# Altium footprint library Apalis Evaluation Board.PcbLib: 166 footprints (part 4 of 11)
Each footprint in its own frame and in the unit in brackets; x right, y up, seen from the top. Pads: shape width x height; smd on the part's side, far side on the other; paste and mask are expansions set on the pad; w line width, h text height; cw(c..) or ccw(c..) is an arc to the next point about the centre after c.
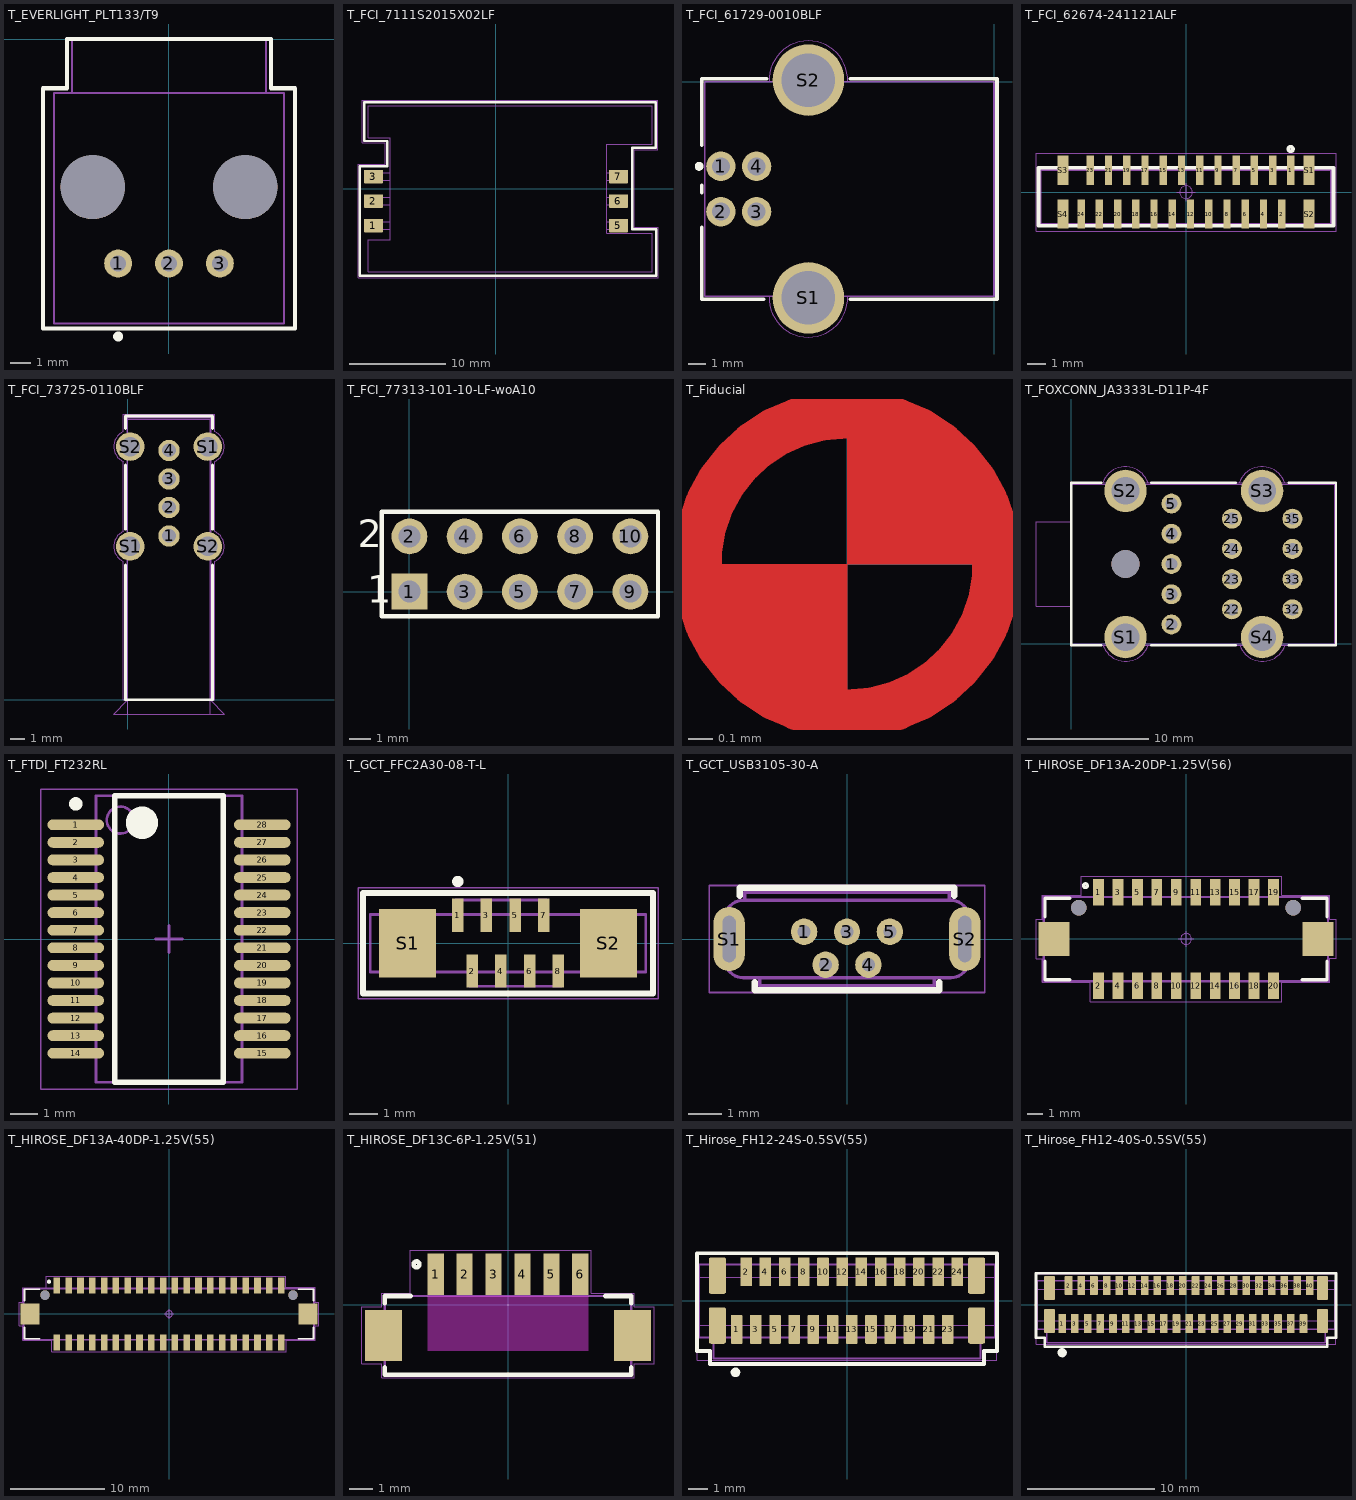
[diagram p3: the footprints below, top view; thin cyan lines are the x and y axes]

## T_EVERLIGHT_PLT133/T9 [mm] "USB Type B Connectors"
height 20
pads (5):
  round 1.4 hole 0.8: 1(-2.54,-11.21) 2(0,-11.21) 3(2.54,-11.21)
  round 3.2 hole 3.2 unplated: ""(-3.81,-7.4) ""(3.81,-7.4)
Top Overlay:
  circle w0.25: c-2.54,-14.86 r0.125
  lines w0.2: -6.3,-14.46 6.3,-14.46 6.3,-2.46 5.1,-2.46 5.1,0 -5.1,0 -5.1,-2.46 -6.3,-2.46 -6.3,-14.46
Mechanical 1:
  lines w0.05: -6.3,-14.46 -6.3,-2.46 -5.1,-2.46 -5.1,0 5.1,0 5.1,-2.46 6.3,-2.46 6.3,-14.46 -6.3,-14.46
Mechanical 2:
  lines w0.01: -4.85,-2.7 -4.85,0 4.85,0 4.85,-2.7 ; -5.75,-14.21 5.75,-14.21 5.75,-2.7 -5.75,-2.7 -5.75,-14.21
Mechanical 3:
  lines w0.1: -4.85,-2.7 -4.85,0 4.85,0 4.85,-2.7 ; -5.75,-14.21 5.75,-14.21 5.75,-2.7 -5.75,-2.7 -5.75,-14.21
3D body: height 19.12, standoff -4.15, extent -5.75,-13.715 5.75,0.085

## T_FCI_7111S2015X02LF [mm] "6 Contacts Sim Card Holder"
height 2.5
pads (6):
  rrect12% 2x1.4 smd: 1(-12.7,-3.81) 2(-12.7,-1.27) 3(-12.7,1.27) 5(12.7,-3.81) 6(12.7,-1.27) 7(12.7,1.27)
Top Overlay:
  lines w0.254: -14.1,-9 -14.1,2.35 -11.25,2.35 -11.25,4.95 -13.65,4.95 -13.65,8.95 16.55,8.95 16.55,4.25 14.15,4.25 14.15,-4.2 16.6,-4.2 16.6,-9 -14.1,-9
Mechanical 1:
  lines w0.05: -14.3,-9.2 16.8,-9.2 16.8,-4 14.35,-4 14.35,4.05 16.75,4.05 16.75,9.15 -13.85,9.15 -13.85,4.75 -11.45,4.75 -11.45,2.55 -14.3,2.55 -14.3,-9.2
Mechanical 2:
  lines w0.01: -10.95,-4.21 -13.25,-4.21 -13.25,-3.41 -10.95,-3.41 ; -10.95,-1.67 -13.25,-1.67 -13.25,-0.87 -10.95,-0.87 ; -10.95,0.87 -13.25,0.87 -13.25,1.67 -10.95,1.67 ; 11.49,-4.21 13.25,-4.21 13.25,-3.41 11.49,-3.41 ; 11.49,-1.67 13.25,-1.67 13.25,-0.87 11.49,-0.87 ; 11.49,0.87 13.25,0.87 13.25,1.67 11.49,1.67 ; -13.25,-8.6 -13.25,-5.3 -10.95,-5.3 -10.95,5.3 -13.25,5.3 -13.25,8.6 16.19,8.6 16.19,4.6 11.49,4.6 11.49,-4.6 16.19,-4.6 16.19,-8.6 -13.25,-8.6
Mechanical 3:
  lines w0.1: -13.25,-8.6 16.19,-8.6 16.19,-4.6 11.49,-4.6 11.49,4.6 16.19,4.6 16.19,8.6 -13.25,8.6 -13.25,5.3 -10.95,5.3 -10.95,-5.3 -13.25,-5.3 -13.25,-8.6
3D body: height 2.5, standoff 0, extent -13.552,-8.726 16.448,8.574

## T_FCI_61729-0010BLF [mm] "USB Type B Connectors"
height 10.6
pads (6):
  round 1.65 hole 1: 1(-15.3,-4.73) 2(-15.3,-7.27) 3(-13.3,-7.27) 4(-13.3,-4.73)
  round 4 hole 3: S1(-10.4,-12.1) S2(-10.4,0.1)
Top Overlay:
  circle w0.25: c-16.512,-4.73 r0.125
  lines w0.2: -16.362,-8.14 -16.362,-12.163 -12.89,-12.163 ; -16.362,-6.21 -16.362,-5.8 ; -16.362,-3.55 -16.362,0.162 -12.737,0.162 ; -8.062,-12.163 0.163,-12.163 0.163,0.162 -8.062,0.162
Mechanical 1:
  lines w0.05: -16.2,-12 -12.598,-12 ccw(c-10.4,-12.096) -8.202,-12 0,-12 0,-0.003 -0.003,0 -8.202,0 ccw(c-10.4,0.096) -12.598,0 -16.2,0 -16.2,-12
Mechanical 2:
  lines w0.001: -16.2,-12 0,-12 0,0 -16.2,0 -16.2,-12
Mechanical 3:
  lines w0.1: -16.2,-12 0,-12 0,0 -16.2,0 -16.2,-12
3D body: height 11.02, standoff -3.7, extent -16.61,-13.43 -0.31,1.469

## T_FCI_62674-241121ALF [mm] "DVI FFC Connector 0.5mm pitch"
height 4.1
pads (28):
  rect 0.4x1.6 smd: 1(5.75,1.2) 2(5.25,-1.2) 3(4.75,1.2) 4(4.25,-1.2) 5(3.75,1.2) 6(3.25,-1.2) 7(2.75,1.2) 8(2.25,-1.2) 9(1.75,1.2) 10(1.25,-1.2) 11(0.75,1.2) 12(0.25,-1.2) 13(-0.25,1.2) 14(-0.75,-1.2) 15(-1.25,1.2) 16(-1.75,-1.2) 17(-2.25,1.2) 18(-2.75,-1.2) 19(-3.25,1.2) 20(-3.75,-1.2) 21(-4.25,1.2) 22(-4.75,-1.2) 23(-5.25,1.2) 24(-5.75,-1.2)
  rect 0.6x1.6 smd: S1(6.75,1.2) S2(6.75,-1.199) S3(-6.75,1.2) S4(-6.75,-1.2)
Top Overlay:
  circle w0.2: c5.742,2.367 r0.125
  lines w0.2: -8.089,-1.836 8.086,-1.836 8.086,1.342 -8.086,1.342 -8.086,-1.831
Mechanical 1:
  circle w0.05: c0,0 r0.35
  lines w0.05: -0.5,0 0.5,0 ; 0,-0.5 0,0.5 ; -8.226,-2.141 8.226,-2.141 8.226,2.141 -8.226,2.141 -8.226,-2.141
Mechanical 2:
  lines w0.001: -7.95,-1.7 7.95,-1.7 7.95,1.2 -7.95,1.2 -7.95,-1.7
Mechanical 3:
  lines w0.1: -8.011,-1.761 8.011,-1.761 8.011,1.276 -8.011,1.276 -8.011,-1.761

## T_FCI_73725-0110BLF [mm] "USB Type A Connector Vertical"
height 13.83
pads (8):
  round 1.5 hole 0.95: 1(2.88,11.49) 2(2.88,13.49) 3(2.88,15.49) 4(2.88,17.49)
  round 2 hole 1.37: S1(0.16,10.76) S1(5.6,17.76) S2(0.16,17.76) S2(5.6,10.76)
Top Overlay:
  lines w0.2: -0.166,9.463 -0.166,0 5.926,0 5.926,9.463 ; -0.166,11.964 -0.166,16.474 ; -0.166,19.025 -0.166,19.898 5.926,19.898 5.926,19.025 ; 5.922,11.964 5.922,16.474
Mechanical 1:
  lines w0.05: -0.322,9.709 -0.322,0 6.081,0 6.081,9.707 ; -0.322,18.812 -0.322,20.046 -0.32,20.048 6.081,20.048 ; -0.321,9.708 cw(c0.16,10.76) -0.322,11.812 ; -0.321,11.813 -0.321,16.708 cw(c0.16,17.76) -0.322,18.812 ; 6.081,16.707 6.081,11.812 cw(c5.6,10.76) 6.082,9.708 ; 6.081,18.812 cw(c5.6,17.76) 6.082,16.708 ; 6.082,18.814 6.082,20.048
Mechanical 2:
  lines w0.001: 0,-1 0,19.678 5.76,19.678 5.76,-1 ; -1,-1 0,0 5.76,0 6.76,-1 -1,-1
Mechanical 3:
  lines w0.1: -0.068,19.778 5.826,19.778 5.826,0 -0.065,0 -0.065,19.778

## T_FCI_77313-101-10-LF-woA10 [mm] "2.54 mm header"
height 10.8
pads (10):
  rect 1.65x1.65 hole 1: 1(0,0)
  round 1.65 hole 1: 2(0,2.54) 3(2.54,0) 4(2.54,2.54) 5(5.08,0) 6(5.08,2.54) 7(7.62,0) 8(7.62,2.54) 9(10.16,0) 10(10.16,2.54)
Top Overlay:
  lines w0.2: -1.27,-1.14 11.43,-1.14 ; -1.27,-1.137 -1.27,3.68 11.43,3.68 11.43,-1.137
  text "2" at -2.364,2.048 h1.27
  text "1" at -1.941,-0.522 h1.27
Mechanical 1:
  lines w0.05: -1.27,-1.14 11.43,-1.14 ; -1.27,-1.137 -1.27,3.68 11.43,3.68 11.43,-1.137
Mechanical 2:
  lines w0.001: -1.27,-1.14 11.43,-1.14 11.43,3.68 -1.27,3.68 -1.27,-1.14
Mechanical 3:
  lines w0.1: -1.27,-1.14 11.43,-1.14 ; -1.27,-1.137 -1.27,3.68 11.43,3.68 11.43,-1.137

## T_Fiducial [mm] "Fiducial"
Top Layer:
  region: 0,-0.625 -0.375,-0.5 -0.625,-0.25 -0.625,0 0,0
  region: 0.625,0 0,0 0,0.625 0.375,0.5 0.625,0.25
  lines w0.203: 0,-0.625 ccw(c0,0) 0,0.625 ccw(c0,0) 0,-0.625
Top Solder:
  circle w0.203: c0,0 r0.625
  region: 0.625,0 0.5,-0.375 0.25,-0.625 -0.25,-0.625 -0.5,-0.375 -0.625,0 -0.5,0.375 -0.375,0.5 0,0.625 0.375,0.5 0.5,0.25 0.5,0.375 0.375,0.5

## T_FOXCONN_JA3333L-D11P-4F [mm] "Audio Jack Triple Stacked DIP Type With Sense"
height 35.5
pads (18):
  round 1.65 hole 1: 1(8.3,6.6) 2(8.3,1.6) 3(8.3,4.1) 4(8.3,9.1) 5(8.3,11.6) 22(13.3,2.85) 23(13.3,5.35) 24(13.3,7.85) 25(13.3,10.35) 32(18.3,2.85) 33(18.3,5.35) 34(18.3,7.85) 35(18.3,10.35)
  round 3.5 hole 2.3: S1(4.5,0.55) S2(4.5,12.65) S3(15.8,12.65) S4(15.8,0.55)
  round 2.3 hole 2.3 unplated: ""(4.5,6.6)
Top Overlay:
  lines w0.2: 0,-0.105 2.5,-0.105 ; 0,-0.082 0,13.305 2.5,13.305 ; 6.625,-0.105 13.625,-0.105 ; 6.625,13.305 13.625,13.305 ; 18,-0.105 21.903,-0.105 21.905,-0.105 21.905,13.305 18,13.305
Mechanical 1:
  lines w0.05: 2.604,13.299 cw(c4.484,12.666) 6.363,13.301 ; 2.604,13.3 0,13.3 0,-0.1 2.637,-0.1 ; 2.637,-0.101 ccw(c4.516,0.533) 6.396,-0.099 ; 6.363,13.3 13.904,13.3 ; 6.396,-0.1 13.937,-0.1 ; 13.904,13.299 cw(c15.784,12.666) 17.663,13.301 ; 13.937,-0.101 ccw(c15.816,0.533) 17.696,-0.099 ; 17.663,13.3 21.9,13.3 21.9,-0.1 17.696,-0.1
Mechanical 2:
  lines w0.001: 0,3.1 -2.9,3.1 -2.9,10.1 0,10.1 ; 0,0 0,13.2 21.8,13.2 21.8,0 0,0
Mechanical 3:
  lines w0.1: 0,-0.1 21.901,-0.1 ; 0,13.3 21.9,13.3 21.902,13.298 21.902,-0.1 ; 0.001,-0.074 0.001,13.326 ; 21.901,-0.1 21.902,-0.1
3D body: height 31.5, standoff 28.5, extent -2.905,5.105 0.01,8.093
3D body: height 19, standoff 16, extent -2.905,5.105 0.01,8.093
3D body: height 6.5, standoff 3.5, extent -2.905,5.105 0.01,8.093
3D body: height 21.01, standoff 13.99, extent -2.9,3.1 0,10.1
3D body: height 33.51, standoff 26.49, extent -2.9,3.1 0,10.1
3D body: height 8.51, standoff 1.49, extent -2.9,3.1 0,10.1
3D body: height 38.5, standoff 0, extent 0,0 21.8,13.2

## T_FTDI_FT232RL [mm] "28-Pin SSOP 0.65 mm Pitch"
height 2
pads (28):
  oval 2.1x0.4 smd: 1(-3.45,4.225) 2(-3.45,3.575) 3(-3.45,2.925) 4(-3.45,2.275) 5(-3.45,1.625) 6(-3.45,0.975) 7(-3.45,0.325) 8(-3.45,-0.325) 9(-3.45,-0.975) 10(-3.45,-1.625) 11(-3.45,-2.275) 12(-3.45,-2.925) 13(-3.45,-3.575) 14(-3.45,-4.225) 15(3.45,-4.225) 16(3.45,-3.575) 17(3.45,-2.925) 18(3.45,-2.275) 19(3.45,-1.625) 20(3.45,-0.975) 21(3.45,-0.325) 22(3.45,0.325) 23(3.45,0.975) 24(3.45,1.625) 25(3.45,2.275) 26(3.45,2.925) 27(3.45,3.575) 28(3.45,4.225)
Top Overlay:
  circle w0.6: c-1,4.3 r0.3
  circle w0.25: c-3.45,5 r0.125
  lines w0.2: -2,-5.3 2,-5.3 2,5.3 -2,5.3 -2,-5.3
Mechanical 1:
  lines w0.05: -4.75,-5.55 -4.75,5.55 4.75,5.55 4.75,-5.55 -4.75,-5.55
  lines w0.1: -0.5,0 0.5,0 ; 0,-0.5 0,0.5
Mechanical 2:
  lines w0.001: -2.7,-5.3 2.7,-5.3 2.7,5.3 -2.7,5.3 -2.7,-5.3
Mechanical 3:
  circle w0.1: c-1.8,4.4 r0.5
  lines w0.1: -2.7,-5.3 -2.7,5.3 2.7,5.3 2.7,-5.3 -2.7,-5.3
3D body: height 2, standoff 0, extent -2.7,-5.3 2.7,5.3

## T_GCT_FFC2A30-08-T-L [mm] "JTAG FFC Connector 0.5mm pitch vertical"
height 5.4
pads (10):
  rect 0.4x1.15 smd: 1(-1.75,0.975) 2(-1.25,-0.975) 3(-0.75,0.975) 4(-0.25,-0.975) 5(0.25,0.975) 6(0.75,-0.975) 7(1.25,0.975) 8(1.75,-0.975)
  rect 2x2.4 smd: S1(-3.5,0) S2(3.5,0)
Top Overlay:
  circle w0.254: c-1.75,2.15 r0.071
  lines w0.2: -5.05,-1.75 -5.05,1.75 5.05,1.75 5.05,-1.75 -5.05,-1.75
Mechanical 1:
  lines w0.05: -5.225,-1.925 -5.225,1.925 5.225,1.925 5.225,-1.925 -5.225,-1.925
Mechanical 2:
  lines w0.001: -4.25,-1 -4.25,1 ; -1.85,1 -1.85,1.5 1.35,1.5 1.35,1 ; -1.35,-1 -1.35,-1.5 1.85,-1.5 1.85,-1 ; 4.25,-1 4.25,1 ; -4.8,-1 -4.8,1 4.8,1 4.8,-1 -4.8,-1
Mechanical 3:
  lines w0.1: -1.85,1 -1.85,1.5 1.35,1.5 1.35,1 ; -1.35,-1 -1.35,-1.5 1.85,-1.5 1.85,-1 ; -4.8,-1 4.8,-1 4.8,1 -4.8,1 -4.8,-1
3D body: height 4.4, standoff 2.5, extent -4.8,-1 4.8,1
3D body: height 2.5, standoff 0, extent -4.25,-1 4.25,1

## T_GCT_USB3105-30-A [mm] "Micro USB Connector Vertical"
height 5.6
pads (7):
  round 0.8 hole 0.4: 1(-1.3,0.22) 2(-0.65,-0.78) 3(0,0.22) 4(0.65,-0.78) 5(1.3,0.22)
  oval 0.95x1.95 hole 0.4 slot 1.4 at 90 deg: S1(-3.575,0) S2(3.575,0)
Top Overlay:
  lines w0.2: -3.25,1.32 -3.25,1.55 3.25,1.55 3.25,1.32 ; -2.8,-1.32 -2.8,-1.55 2.8,-1.55 2.8,-1.32
Mechanical 1:
  lines w0.05: -4.175,-1.625 -4.175,1.625 4.175,1.625 4.175,-1.625 -4.175,-1.625
Mechanical 2:
  lines w0.001: -3.7,-0.175 -3.945,-0.175 -3.945,0.625 -3.7,0.625 ; -3.1,1.175 -3.1,1.42 3.1,1.42 3.1,1.175 ; -2.65,-1.175 -2.65,-1.42 2.65,-1.42 2.65,-1.175 ; 3.15,1.175 cw(c3.15,0.625) 3.7,0.625 ; 3.175,1.175 -3.15,1.175 ccw(c-3.15,0.625) -3.7,0.625 ; 3.7,-0.175 3.945,-0.175 3.945,0.625 3.7,0.625 ; -3.7,0.625 -3.7,-0.625 ccw(c-3.15,-0.625) -3.15,-1.175 3.15,-1.175 ccw(c3.15,-0.625) 3.7,-0.625 3.7,0.625
Mechanical 3:
  lines w0.1: -3.7,-0.175 -3.945,-0.175 -3.945,0.625 -3.7,0.625 ; -3.1,1.175 -3.1,1.42 3.1,1.42 3.1,1.175 ; -2.65,-1.175 -2.65,-1.42 2.65,-1.42 2.65,-1.175 ; 3.15,1.175 cw(c3.15,0.625) 3.7,0.625 ; 3.175,1.175 -3.15,1.175 ccw(c-3.15,0.625) -3.7,0.625 ; 3.7,-0.175 3.945,-0.175 3.945,0.625 3.7,0.625 ; -3.7,0.625 -3.7,-0.625 ccw(c-3.15,-0.625) -3.15,-1.175 3.15,-1.175 ccw(c3.15,-0.625) 3.7,-0.625 3.7,0.625
3D body: height 5.62, standoff -1.48, extent -3.98,-1.455 3.98,1.48

## T_HIROSE_DF13A-20DP-1.25V(56) [mm]
height 4.8
pads (24):
  rect 0.7x1.7 smd: 1(-5.625,3) 2(-5.625,-3) 3(-4.375,3) 4(-4.375,-3) 5(-3.125,3) 6(-3.125,-3) 7(-1.875,3) 8(-1.875,-3) 9(-0.625,3) 10(-0.625,-3) 11(0.625,3) 12(0.625,-3) 13(1.875,3) 14(1.875,-3) 15(3.125,3) 16(3.125,-3) 17(4.375,3) 18(4.375,-3) 19(5.625,3) 20(5.625,-3)
  rect 2x2.2 smd: ""(-8.475,0) ""(8.475,0)
  round 1 hole 1 unplated paste+0 mask+0: ""(-6.875,2) ""(6.875,2)
Top Overlay:
  circle w0.2: c-6.455,3.42 r0.125
  lines w0.2: -9.04,-1.42 -9.04,-2.62 -7.463,-2.62 ; -9.04,1.41 -9.04,2.61 -7.463,2.61 ; 7.463,-2.62 9.04,-2.62 9.04,-1.42 ; 7.463,2.61 9.04,2.61 9.04,1.41
Mechanical 1:
  circle w0.05: c0,0 r0.35
  lines w0.05: -0.5,0 0.5,0 ; 0,-0.5 0,0.5 ; 9.222,1.255 9.222,2.804 8.052,2.804 6.136,2.804 6.136,4.01 -6.726,4.01 -6.726,2.796 -9.216,2.796 -9.216,1.652 -9.216,1.252 -9.63,1.252 -9.63,-1.258 -9.218,-1.258 -9.218,-2.796 -6.142,-2.796 -6.142,-4.02 6.143,-4.02 6.143,-2.796 9.221,-2.796 9.221,-1.248 9.63,-1.248 ; 9.224,1.255 9.63,1.255 9.63,-1.237
Mechanical 2:
  lines w0.001: -9.175,-2.75 -9.175,2.75 9.175,2.75 9.175,-2.75 -9.175,-2.75
Mechanical 3:
  lines w0.1: -9.1,-2.68 -9.1,2.67 9.1,2.67 9.1,-2.68 -9.1,-2.68
3D body: height 4.8, standoff 0, extent -9.175,-3.45 9.175,3.45

## T_HIROSE_DF13A-40DP-1.25V(55) [mm]
height 4.8
pads (44):
  rect 0.7x1.7 smd: 1(-11.875,3) 2(-11.875,-3) 3(-10.625,3) 4(-10.625,-3) 5(-9.375,3) 6(-9.375,-3) 7(-8.125,3) 8(-8.125,-3) 9(-6.875,3) 10(-6.875,-3) 11(-5.625,3) 12(-5.625,-3) 13(-4.375,3) 14(-4.375,-3) 15(-3.125,3) 16(-3.125,-3) 17(-1.875,3) 18(-1.875,-3) 19(-0.625,3) 20(-0.625,-3) 21(0.625,3) 22(0.625,-3) 23(1.875,3) 24(1.875,-3) 25(3.125,3) 26(3.125,-3) 27(4.375,3) 28(4.375,-3) 29(5.625,3) 30(5.625,-3) 31(6.875,3) 32(6.875,-3) 33(8.125,3) 34(8.125,-3) 35(9.375,3) 36(9.375,-3) 37(10.625,3) 38(10.625,-3) 39(11.875,3) 40(11.875,-3)
  rect 2x2.2 smd: ""(-14.725,0) ""(14.725,0)
  round 1 hole 1 unplated paste+0 mask+0: ""(-13.125,2) ""(13.125,2)
Top Overlay:
  circle w0.2: c-12.705,3.42 r0.125
  lines w0.2: -15.29,-1.42 -15.29,-2.62 -13.713,-2.62 ; -15.29,1.41 -15.29,2.61 -13.713,2.61 ; 13.713,-2.62 15.29,-2.62 15.29,-1.42 ; 13.713,2.61 15.29,2.61 15.29,1.41
Mechanical 1:
  circle w0.05: c0,0 r0.35
  lines w0.05: -0.5,0 0.5,0 ; 0,-0.5 0,0.5 ; 15.472,1.255 15.472,2.804 14.302,2.804 12.386,2.804 12.386,4.01 -12.976,4.01 -12.976,2.796 -15.466,2.796 -15.466,1.652 -15.466,1.252 -15.88,1.252 -15.88,-1.258 -15.468,-1.258 -15.468,-2.796 -12.392,-2.796 -12.392,-4.02 12.393,-4.02 12.393,-2.796 15.471,-2.796 15.471,-1.248 15.88,-1.248 ; 15.474,1.255 15.88,1.255 15.88,-1.237
Mechanical 2:
  lines w0.001: -15.425,-2.75 -15.425,2.75 15.425,2.75 15.425,-2.75 -15.425,-2.75
Mechanical 3:
  lines w0.1: -15.35,-2.68 -15.35,2.67 15.35,2.67 15.35,-2.68 -15.35,-2.68
3D body: height 4.82, standoff 0.02, extent -15.425,-3.45 15.425,3.45

## T_HIROSE_DF13C-6P-1.25V(51) [mm] "Touch connector"
height 4.8
pads (8):
  rect 0.7x1.8 smd: 1(-3.125,1.324) 2(-1.875,1.324) 3(-0.625,1.324) 4(0.625,1.324) 5(1.875,1.324) 6(3.125,1.324)
  rect 1.6x2.2 smd: ""(-5.385,-1.324) ""(5.385,-1.324)
Top Overlay:
  circle w0.2: c-3.955,1.744 r0.125
  lines w0.2: -5.325,-2.713 -5.325,-3.024 5.325,-3.024 5.325,-2.713 ; -5.325,0.064 -5.325,0.376 -4.201,0.376 ; 4.201,0.376 5.325,0.376 5.325,0.064
Keep-Out Layer:
  rectangle: -3.475,-1.994 3.475,0.376
Mechanical 1:
  lines w0.05: -6.316,-2.555 -6.316,-0.093 -5.456,-0.093 -5.456,0.506 -4.226,0.506 -4.226,2.354 3.606,2.354 3.606,0.507 5.456,0.507 5.456,-0.092 6.316,-0.093 6.316,-2.555 5.456,-2.555 5.456,-3.155 -5.456,-3.155 -5.456,-2.555 -6.316,-2.555
Mechanical 2:
  lines w0.001: -5.325,-2.224 -6.075,-2.224 -6.075,-0.424 -5.325,-0.424 ; 5.325,-2.224 6.075,-2.224 6.075,-0.424 5.325,-0.424 ; -5.325,-3.024 -5.325,0.376 5.325,0.376 5.325,-3.024 -5.325,-3.024
Mechanical 3:
  lines w0.1: -5.325,-3.024 -5.325,0.376 5.325,0.376 5.325,-3.024 -5.325,-3.024

## T_Hirose_FH12-24S-0.5SV(55) [mm] "FFC Connector 0.5mm pitch Vertical"
height 5.5
pads (28):
  rrect12% 0.6x1.5 smd: 1(-5.75,-1.5) 2(-5.25,1.5) 3(-4.75,-1.5) 4(-4.25,1.5) 5(-3.75,-1.5) 6(-3.25,1.5) 7(-2.75,-1.5) 8(-2.25,1.5) 9(-1.75,-1.5) 10(-1.25,1.5) 11(-0.75,-1.5) 12(-0.25,1.5) 13(0.25,-1.5) 14(0.75,1.5) 15(1.25,-1.5) 16(1.75,1.5) 17(2.25,-1.5) 18(2.75,1.5) 19(3.25,-1.5) 20(3.75,1.5) 21(4.25,-1.5) 22(4.75,1.5) 23(5.25,-1.5) 24(5.75,1.5)
  rrect25% 0.9x1.9 smd: ""(-6.75,-1.3) ""(-6.75,1.3) ""(6.75,-1.3) ""(6.75,1.3)
Top Overlay:
  circle w0.25: c-5.81,-3.738 r0.125
  lines w0.2: -7.814,-2.625 -7.814,2.464 7.814,2.464 7.814,-2.625 7.132,-2.625 7.132,-3.307 -7.132,-3.307 -7.132,-2.625 -7.814,-2.625
Mechanical 1:
  lines w0.05: -7.8,-3.116 7.8,-3.116 7.8,2.416 -7.8,2.416 -7.8,-3.116
Mechanical 2:
  lines w0.001: -7.7,-1.275 7.7,-1.275 ; -7.7,1.225 7.7,1.225 ; -6.95,-1.925 -6.95,-3.025 6.95,-3.025 6.95,-1.925 ; -7.7,-1.925 7.7,-1.925 7.7,1.875 -7.7,1.875 -7.7,-1.925
Mechanical 3:
  lines w0.1: -6.95,-1.925 -6.95,-3.025 6.95,-3.025 6.95,-1.925 ; -7.7,-1.925 7.7,-1.925 7.7,1.875 -7.7,1.875 -7.7,-1.925
3D body: height 5.52, standoff 0.02, extent -7.7,-1.925 7.7,1.875

## T_Hirose_FH12-40S-0.5SV(55) [mm] "FFC Connector 0.5mm pitch Vertical"
height 5.5
pads (44):
  rrect12% 0.6x1.5 smd: 1(-9.75,-1.5) 2(-9.25,1.5) 3(-8.75,-1.5) 4(-8.25,1.5) 5(-7.75,-1.5) 6(-7.25,1.5) 7(-6.75,-1.5) 8(-6.25,1.5) 9(-5.75,-1.5) 10(-5.25,1.5) 11(-4.75,-1.5) 12(-4.25,1.5) 13(-3.75,-1.5) 14(-3.25,1.5) 15(-2.75,-1.5) 16(-2.25,1.5) 17(-1.75,-1.5) 18(-1.25,1.5) 19(-0.75,-1.5) 20(-0.25,1.5) 21(0.25,-1.5) 22(0.75,1.5) 23(1.25,-1.5) 24(1.75,1.5) 25(2.25,-1.5) 26(2.75,1.5) 27(3.25,-1.5) 28(3.75,1.5) 29(4.25,-1.5) 30(4.75,1.5) 31(5.25,-1.5) 32(5.75,1.5) 33(6.25,-1.5) 34(6.75,1.5) 35(7.25,-1.5) 36(7.75,1.5) 37(8.25,-1.5) 38(8.75,1.5) 39(9.25,-1.5) 40(9.75,1.5)
  rrect25% 0.9x1.9 smd: ""(-10.75,-1.3) ""(-10.75,1.3) ""(10.75,-1.3) ""(10.75,1.3)
Top Overlay:
  circle w0.4: c-9.75,-3.79 r0.16
  lines w0.2: 11.13,-3.307 -11.132,-3.307 -11.132,-2.625 -11.814,-2.625 -11.814,2.464 11.814,2.464 11.814,-2.625 11.132,-2.625 11.132,-3.307
Mechanical 1:
  lines w0.05: -11.8,-3.116 -11.8,2.416 11.8,2.416 11.8,-3.116 -11.8,-3.116
Mechanical 2:
  lines w0.001: -11.7,-1.275 11.7,-1.275 ; -11.7,1.225 11.7,1.225 ; -10.95,-1.925 -10.95,-3.025 10.95,-3.025 10.95,-1.925 ; -11.7,-1.925 -11.7,1.875 11.7,1.875 11.7,-1.925 -11.7,-1.925
Mechanical 3:
  lines w0.1: -10.95,-1.925 -10.95,-3.025 10.95,-3.025 10.95,-1.925 ; -11.7,-1.925 -11.7,1.875 11.7,1.875 11.7,-1.925 -11.7,-1.925
3D body: height 5.52, standoff 0.02, extent -11.7,-1.925 11.7,1.875